# Altium footprint library controller_esp8266.PcbLib: 13 footprints
Each footprint in its own frame and in the unit in brackets; x right, y up, seen from the top. Pads: shape width x height; smd on the part's side, far side on the other; paste and mask are expansions set on the pad; w line width, h text height; cw(c..) or ccw(c..) is an arc to the next point about the centre after c.
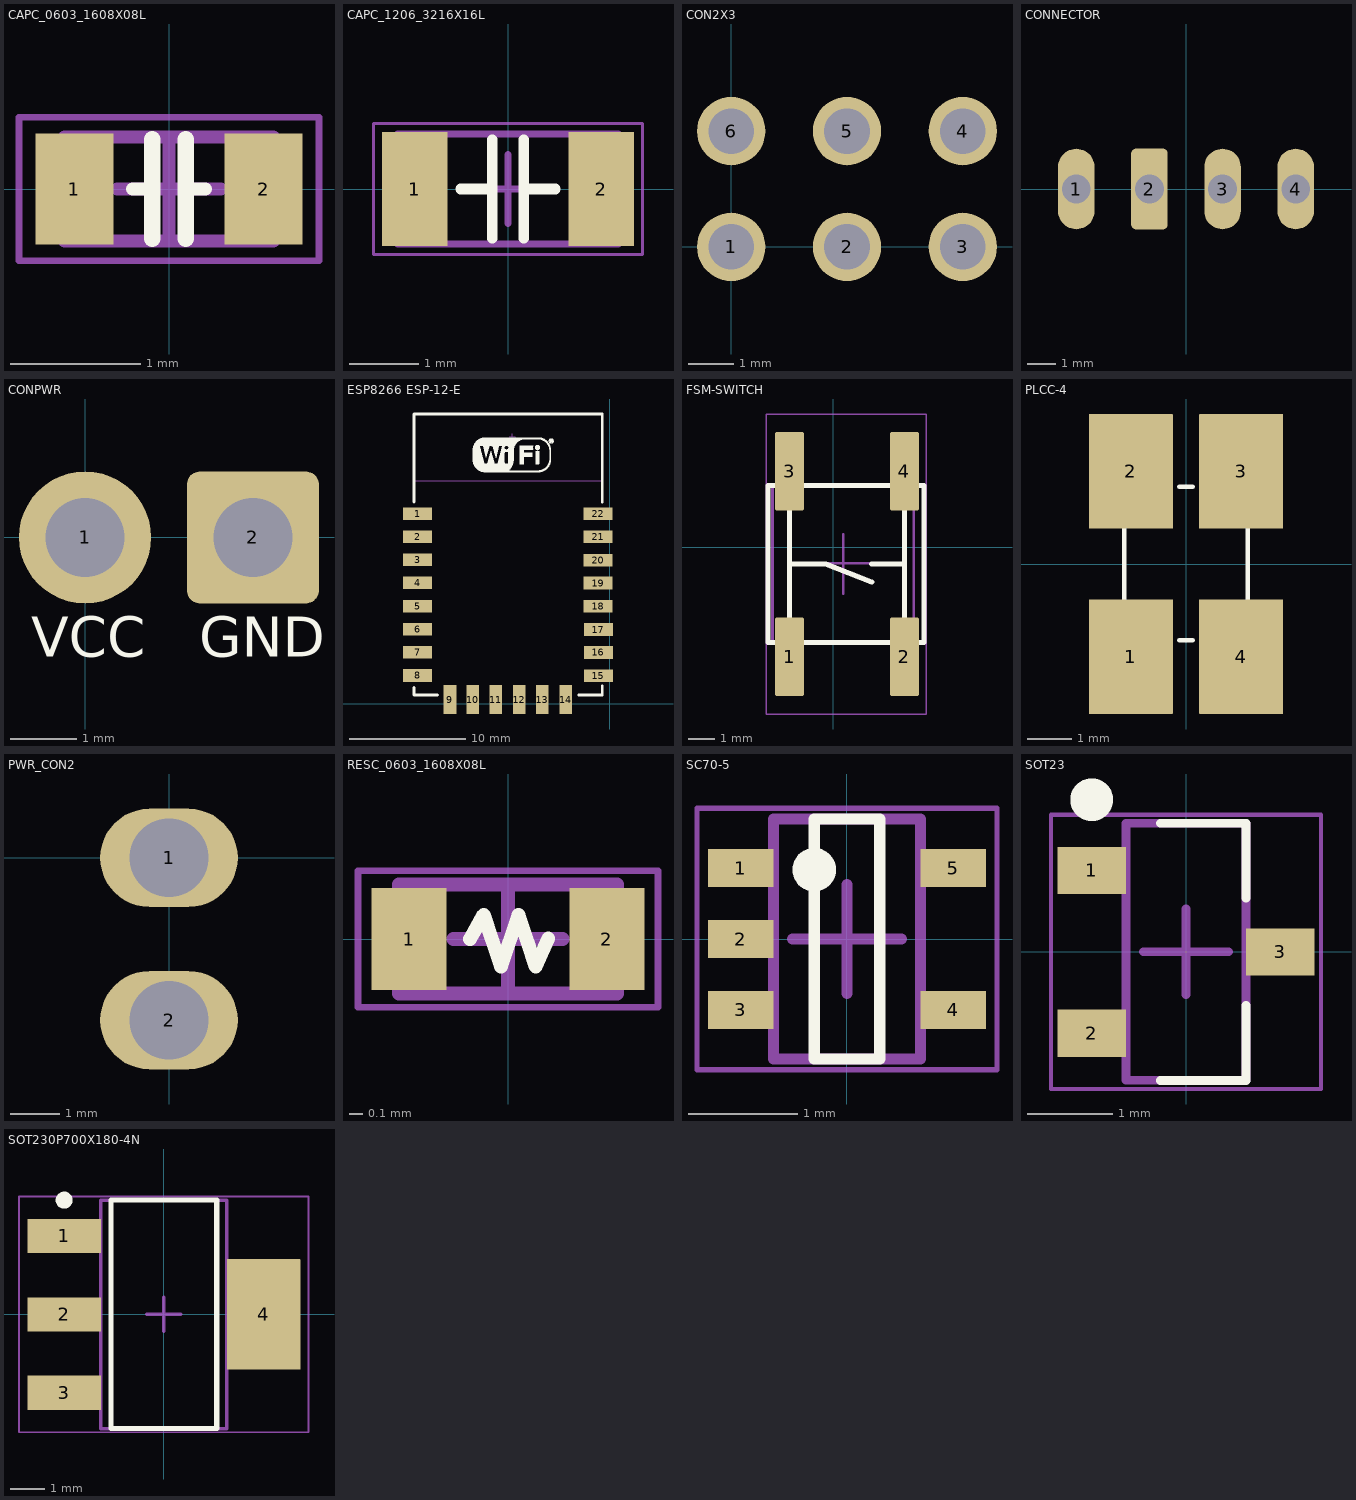
[diagram p0: the footprints below, top view; thin cyan lines are the x and y axes]

## CAPC_0603_1608X08L [mm] "Chip Capacitor 0603"
height 0.8
pads (2):
  rrect1% 0.6x0.85 smd: 1(-0.725,0) 2(0.725,0)
Top Overlay:
  lines w0.102: -0.279,0 -0.127,0 ; 0.127,0 0.279,0
  lines w0.127: -0.127,-0.381 -0.127,0.381 ; 0.127,-0.381 0.127,0.381
Mechanical 13:
  lines w0.1: -0.8,-0.4 0.8,-0.4 0.8,0.4 -0.8,0.4 -0.8,-0.4
Mechanical 15:
  lines w0.05: -1.15,-0.55 1.15,-0.55 1.15,0.55 -1.15,0.55 -1.15,-0.55
  lines w0.1: -0.4,0 0.4,0 ; 0,-0.4 0,0.4
3D body "CAPC_0603_1608X08L.step": height 0.8, standoff 0, extent -0.8,-0.4 0.8,0.4

## CAPC_1206_3216X16L [mm] "Chip Capacitor 1206"
height 1.6
pads (2):
  rrect1% 0.95x1.65 smd: 1(-1.35,0) 2(1.35,0)
Top Overlay:
  lines w0.152: -0.686,0 -0.229,0 ; -0.229,-0.711 -0.229,0.711 ; 0.229,-0.711 0.229,0.711 ; 0.229,0 0.686,0
Mechanical 13:
  lines w0.1: -1.6,-0.8 -1.6,0.8 1.6,0.8 1.6,-0.8 -1.6,-0.8
Mechanical 15:
  lines w0.05: -1.95,-0.95 -1.95,0.95 1.95,0.95 1.95,-0.95 -1.95,-0.95
  lines w0.1: -0.5,0 0.5,0 ; 0,-0.5 0,0.5
3D body "CAPC_1206_3216X16L.step": height 1.6, standoff 0, extent -1.6,-0.8 1.6,0.8

## CON2X3 [mm] "2x3 2.54mm"
pads (6):
  round 1.5 hole 1 paste+0 mask+0: 1(0,0) 2(2.54,0) 3(5.08,0) 4(5.08,2.54) 5(2.54,2.54) 6(0,2.54)

## CONNECTOR [mm]
pads (4):
  rrect100% 1.27x2.8 hole 1 paste+0: 1(-3.81,0) 3(1.27,0) 4(3.81,0)
  rrect25% 1.27x2.8 hole 1 paste+0: 2(-1.27,0)

## CONPWR [mm]
pads (2):
  round 2 hole 1.2 paste+0: 1(0,0)
  rrect20% 2x2 hole 1.2 paste+0: 2(2.54,0)
Top Overlay:
  text "GND" at 1.727,-1.803 h0.61
  text "VCC" at -0.813,-1.803 h0.61

## ESP8266 ESP-12-E [mm] "ESP8266 ESP-12-E"
pads (22):
  rrect1% 2.5x1.1 smd: 1(-16.586,16.408) 2(-16.586,14.427) 3(-16.586,12.421) 4(-16.586,10.439) 5(-16.586,8.407) 6(-16.586,6.426) 7(-16.586,4.445) 8(-16.586,2.438) 15(-0.965,2.413) 16(-0.965,4.42) 17(-0.965,6.401) 18(-0.991,8.407) 19(-0.991,10.414) 20(-0.991,12.395) 21(-0.991,14.427) 22(-0.991,16.408)
  rrect1% 1.1x2.5 smd: 9(-13.792,0.356) 10(-11.811,0.356) 11(-9.83,0.356) 12(-7.798,0.356) 13(-5.817,0.356) 14(-3.785,0.356)
Top Overlay:
  drawing of 1267 lines, arcs and shapes, not listed
  text ".Designator" at -17.247,-2.134 h1
Mechanical 13:
  lines w0.051: -16.839,19.252 -0.583,19.252
  text "CUTOUT POLYGON" at -16.585,23.891 h0.25
  text "ANTENNA AREA" at -16.585,24.399 h0.25
Mechanical 15:
  lines w0.1: -8.661,23.061 -8.153,23.061 ; -8.407,22.807 -8.407,23.315
3D body "ESP-12F.STEP": height 3.17, standoff 0, extent -16.763,0.827 -0.763,24.827

## FSM-SWITCH [mm]
pads (4):
  rrect10% 1.1x3 smd: 1(-1.669,-4.185) 2(2.731,-4.185) 3(-1.669,2.915) 4(2.731,2.915)
Top Overlay:
  lines w0.2: 3.48,-3.635 -2.489,-3.635 -2.489,2.365 3.48,2.365
  lines w0.203: -1.669,-3.023 -1.669,1.88 ; -1.669,-0.635 -0.279,-0.635 1.473,-1.321 ; 1.473,-0.635 2.731,-0.635 ; 2.731,-3.023 2.731,1.88 ; 3.48,-3.635 3.48,2.365
Mechanical 15:
  lines w0.1: -2.319,-3.635 -2.319,2.365 3.081,2.365 3.081,-3.635 -2.319,-3.635
  lines w0.102: -0.734,-0.607 0.381,-0.607 ; 0.381,-1.778 0.381,-0.607 ; 0.381,-0.635 0.381,0.508 ; 1.394,-0.607 0.381,-0.607
Mechanical 20:
  lines w0.05: -2.565,-6.375 -2.565,5.105 3.556,5.105 3.556,-6.375 -2.565,-6.375
3D body "switch.stp.step": height 5.07, standoff -0.01, extent -2.492,-5.635 3.508,4.365

## PLCC-4 [mm] "LED"
pads (4):
  rrect1% 1.9x2.6 smd paste-10 mask-10: 1(-1.25,-2.1) 2(-1.25,2.1) 3(1.25,2.1) 4(1.25,-2.1)
Top Overlay:
  circle w0.5: c-1.803,1.219 r0.1
  lines w0.102: -1.4,-1.725 -1.4,1.775 ; -0.152,-1.727 0.152,-1.727 ; -0.152,1.753 0.152,1.753 ; 1.4,-1.725 1.4,1.775
Top Paste:
  rectangle: -1.143,0.889 -0.381,2.032
  rectangle: 0.381,0.889 1.143,2.032
  rectangle: 0.381,-2.032 1.143,-0.889
  rectangle: -1.143,-2.032 -0.381,-0.889
Top Solder:
  rectangle: -1.2,-2.1 -0.3,-0.8
  rectangle: 0.3,-2.1 1.2,-0.8
  rectangle: 0.3,0.8 1.2,2.1
  rectangle: -1.2,0.8 -0.3,2.1
3D body "CLV1AFKB(????????? RGB).STEP": height 1.9, standoff 0, extent -1.4,-1.725 1.4,1.775

## PWR_CON2 [mm]
pads (2):
  oval 2.8x2 hole 1.6: 1(0,0) 2(0,-3.302)

## RESC_0603_1608X08L [mm] "Chip Resistor, 2-Leads, Body 1.60x0.80mm, IPC High Density"
height 0.8
pads (2):
  rrect1% 0.55x0.75 smd: 1(-0.725,0) 2(0.725,0)
Top Overlay:
  lines w0.102: -0.279,0 -0.178,0.178 -0.051,-0.203 0.076,0.178 0.203,-0.203 0.295,0.004
Mechanical 13:
  lines w0.1: -0.8,-0.4 0.8,-0.4 0.8,0.4 -0.8,0.4 -0.8,-0.4
Mechanical 15:
  lines w0.05: -1.1,-0.5 1.1,-0.5 1.1,0.5 -1.1,0.5 -1.1,-0.5
  lines w0.1: -0.4,0 0.4,0 ; 0,-0.4 0,0.4
3D body "RESC_0603_1608X08L.step": height 0.8, standoff 0, extent -0.8,-0.4 0.8,0.4

## SC70-5 [mm] "SOT23, 5-Leads, Body 2.00x2.10mm, Pitch 0.65mm"
height 0.8
pads (5):
  rrect1% 0.6x0.35 smd: 1(-0.975,0.65) 2(-0.975,0) 3(-0.975,-0.65) 4(0.975,-0.65) 5(0.975,0.65)
Top Overlay:
  circle w0.15: c-0.3,0.635 r0.125
  lines w0.102: -0.3,-1.1 -0.3,1.1 0.3,1.1 0.3,-1.1 -0.3,-1.1
Mechanical 13:
  lines w0.1: -0.675,-1.1 0.675,-1.1 0.675,1.1 -0.675,1.1 -0.675,-1.1
Mechanical 15:
  lines w0.05: -1.375,-1.2 1.375,-1.2 1.375,1.2 -1.375,1.2 -1.375,-1.2
  lines w0.1: -0.5,0 0.5,0 ; 0,-0.5 0,0.5
3D body "SC70-5.step": height 1.1, standoff 0, extent -1.2,-1.1 1.2,1.1

## SOT23 [mm] "SOT23, 3-Leads, Body 2.90x2.45mm, Pitch 0.95mm, IPC High Density"
height 1.1
pads (3):
  rrect1% 0.8x0.55 smd: 1(-1.1,0.95) 2(-1.1,-0.95) 3(1.1,0)
Top Overlay:
  circle w0.25: c-1.1,1.775 r0.125
  lines w0.102: -0.3,-1.5 0.7,-1.5 0.7,-0.626 ; -0.3,1.5 0.7,1.5 0.7,0.626
Mechanical 13:
  lines w0.1: -0.7,-1.5 -0.7,1.5 0.7,1.5 0.7,-1.5 -0.7,-1.5
Mechanical 15:
  lines w0.05: -1.575,-1.6 -1.575,1.6 1.575,1.6 1.575,-1.6 -1.575,-1.6
  lines w0.1: -0.5,0 0.5,0 ; 0,-0.5 0,0.5
3D body "SOT23.step": height 1.1, standoff 0, extent -1.3,-1.5 1.3,1.5

## SOT230P700X180-4N [mm] "SOT223, 4-Leads, Body 6.50x7.00mm (avg), Pitch 2.30mm, IPC Medium Density"
height 1.8
pads (4):
  rrect1% 2.15x1 smd: 1(-2.925,2.3) 2(-2.925,0) 3(-2.925,-2.3)
  rrect1% 2.15x3.25 smd: 4(2.925,0)
Top Overlay:
  circle w0.25: c-2.925,3.35 r0.125
  lines w0.152: -1.55,-3.35 1.55,-3.35 1.55,3.35 -1.55,3.35 -1.55,-3.35
Mechanical 13:
  lines w0.1: -1.85,-3.35 1.85,-3.35 1.85,3.35 -1.85,3.35 -1.85,-3.35
Mechanical 15:
  lines w0.05: -4.25,-3.454 -4.25,3.454 4.242,3.454 4.242,-3.454 -4.25,-3.454
  lines w0.1: -0.5,0 0.5,0 ; 0,-0.5 0,0.5
3D body "SOT230P700X180-4N.step": height 1.8, standoff 0, extent -3.5,-3.35 3.5,3.35